# Altium footprint library PRL_PDC.PcbLib: 77 footprints (part 3 of 5)
Each footprint in its own frame and in the unit in brackets; x right, y up, seen from the top. Pads: shape width x height; smd on the part's side, far side on the other; paste and mask are expansions set on the pad; w line width, h text height; cw(c..) or ccw(c..) is an arc to the next point about the centre after c.
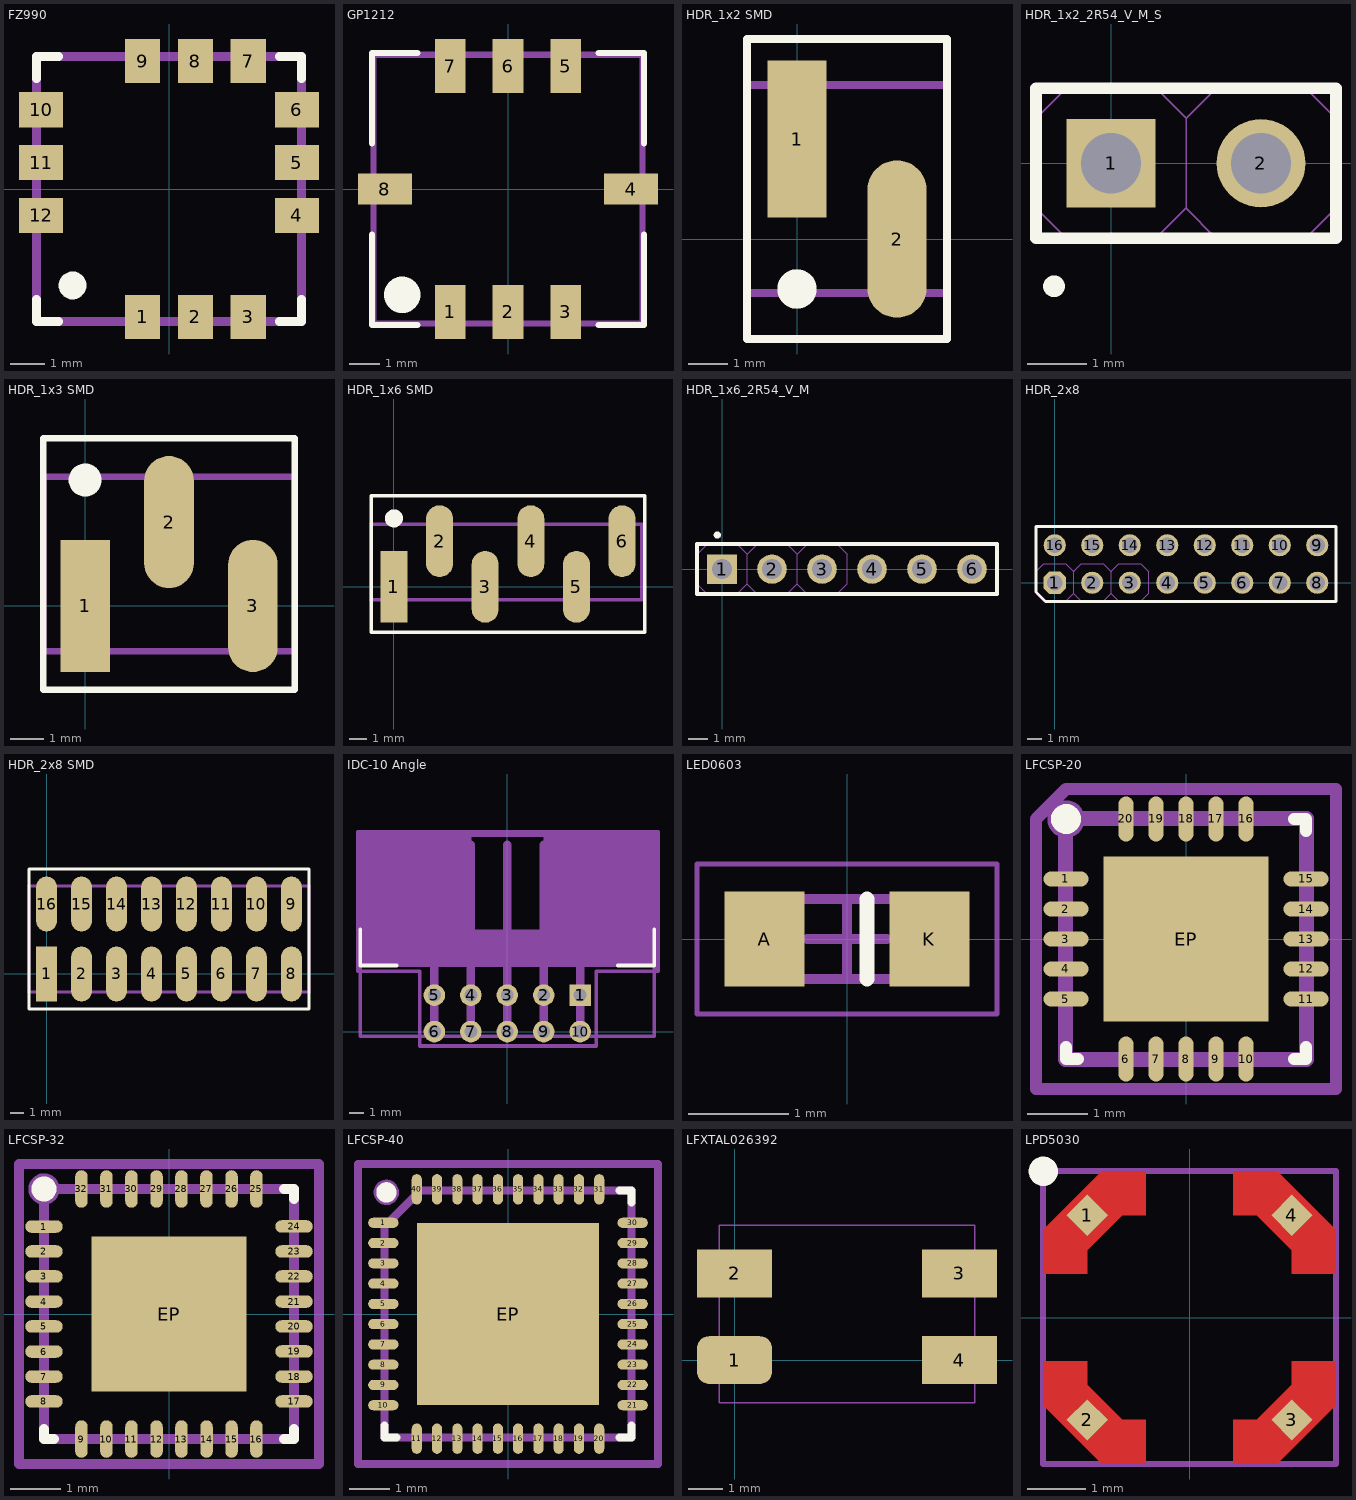
[diagram p2: the footprints below, top view; thin cyan lines are the x and y axes]

## FZ990 [mil]
height 118.11
pads (12):
  rect 40.16x50 smd paste-3.94: 1(-30,-145) 2(30,-145) 3(90,-145) 7(90,145) 8(30,145) 9(-30,145)
  rect 50x40.16 smd paste-3.94: 4(145,-30) 5(145,30) 6(145,90) 10(-145,90) 11(-145,30) 12(-145,-30)
Top Overlay:
  circle w15.75: c-109.32,-109.28 r7.87
  lines w10: -150,-125 -150,-150 -125,-150 ; -150,125 -150,150 -125,150 ; 125,-150 150,-150 150,-125 ; 125,150 150,150 150,125
Mechanical 1:
  lines w10: -150,-150 -150,0 -150,150 0,150 150,150 150,0 150,-150 0,-150 -150,-150
3D body: height 100.39, standoff 78.74, extent -125,-125 -109.32,-109.28
3D body: height 24.02, standoff 3.54, extent -152,-50 -112,-10
3D body: height 24.02, standoff 3.54, extent -152,10 -112,50
3D body: height 24.02, standoff 3.54, extent -152,70 -112,110
3D body: height 24.02, standoff 3.54, extent -50,112 -10,152
3D body: height 24.02, standoff 3.54, extent 10,112 50,152
3D body: height 24.02, standoff 3.54, extent 70,112 110,152
3D body: height 24.02, standoff 3.54, extent 112,70 152,110
3D body: height 24.02, standoff 3.54, extent 112,10 152,50
3D body: height 24.02, standoff 3.54, extent 112,-50 152,-10
3D body: height 24.02, standoff 3.54, extent 70,-152 110,-112
3D body: height 24.02, standoff 3.54, extent 10,-152 50,-112
3D body: height 24.02, standoff 3.54, extent -50,-152 -10,-112
3D body: height 100, standoff 15.75, extent -145,-145 145,145
3D body: height 23.62, standoff 3.94, extent -150,-150 150,150

## GP1212 [mm] "Minicircuits"
height 4
pads (8):
  rect 1.02x1.78 smd paste-0.1: 1(-1.91,-4.065) 2(0,-4.065) 3(1.91,-4.065) 5(1.91,4.065) 6(0,4.065) 7(-1.91,4.065)
  rect 1.78x1.02 smd paste-0.1: 4(4.07,-0.005) 8(-4.07,-0.005)
Top Overlay:
  circle w1: c-3.5,-3.5 r0.1
  lines w0.2: -4.5,-1.5 -4.5,-4.5 -3,-4.5 ; -4.5,1.5 -4.5,4.5 -3,4.5 ; 3,-4.5 4.5,-4.5 4.5,-1.5 ; 3,4.5 4.5,4.5 4.5,1.5
Mechanical 1:
  lines w0.2: -4.445,-4.45 -4.445,4.44 4.445,4.44 4.445,-4.45 -4.445,-4.45
3D body: height 4, standoff 0.1, extent -4.445,-4.45 4.445,4.44

## HDR_1x2 SMD [mm] "Male Header, Pitch 2.54mm, 2x1 Position, Mated Height 6mm, Tail Length 3mm"
height 6
pads (2):
  rect 1.5x4 smd: 1(0,2.54)
  oval 1.5x4 smd: 2(2.54,0)
Top Overlay:
  circle w0.5: c0,-1.27 r0.25
  lines w0.2: -1.27,-2.54 -1.27,5.08 3.81,5.08 3.81,-2.54 -1.27,-2.54
Mechanical 1:
  lines w0.2: -1.27,-1.372 3.81,-1.372 3.81,3.911 -1.27,3.911 -1.27,-1.372
3D body "TSM-102-04-T-SV.stp": height 6.89, standoff 0.03, extent -1.27,-1.372 3.81,3.912

## HDR_1x2_2R54_V_M_S [mm] "Male Header, Pitch 2.54mm, 4x1 Position, Mated Height 6mm, Tail Length 3mm"
height 6
pads (2):
  rect 1.5x1.5 hole 1.02: 1(0,0)
  round 1.5 hole 1.02: 2(2.54,0)
Top Overlay:
  circle w0.25: c-0.965,-2.083 r0.059
  lines w0.2: -1.27,-1.27 3.81,-1.27 3.81,1.27 -1.27,1.27 -1.27,-1.27
Mechanical 13:
  lines w0.025: 3.81,-0.762 3.302,-1.27 ; 3.81,0.762 3.302,1.27 1.778,1.27 1.27,0.762 ; -1.27,-0.762 -0.762,-1.27 ; -1.27,-0.762 -1.27,0.762 ; -1.27,-0.762 -1.27,0.762 ; -1.27,0.762 -0.762,1.27 0.762,1.27 1.27,0.762 ; -0.762,-1.27 0.762,-1.27 ; -0.762,-1.27 0.762,-1.27 ; 0.762,-1.27 1.27,-0.762 ; 1.27,-0.762 1.778,-1.27 ; 1.27,-0.762 1.27,0.762 ; 1.27,-0.762 1.27,0.762 ; 1.27,-0.762 1.27,0.762 ; 1.27,-0.762 1.27,0.762 ; 1.778,-1.27 3.302,-1.27 ; 1.778,-1.27 3.302,-1.27
3D body: height 9, standoff -3, extent 2.19,-0.349 2.887,0.349
3D body: height 2.54, standoff 0, extent 1.27,-1.27 3.81,1.27
3D body: height 9, standoff -3, extent -0.35,-0.349 0.347,0.349
3D body: height 2.54, standoff 0, extent -1.27,-1.27 1.27,1.27

## HDR_1x3 SMD [mm] "Male Header, Pitch 2.54mm, 3x1 Position, Mated Height 6mm, Tail Length 3mm"
height 6
pads (3):
  rect 1.5x4 smd: 1(0,0)
  oval 1.5x4 smd: 2(2.54,2.54) 3(5.08,0)
Top Overlay:
  circle w0.5: c0,3.81 r0.25
  lines w0.2: -1.27,-2.54 6.35,-2.54 6.35,5.08 -1.27,5.08 -1.27,-2.54
Mechanical 1:
  lines w0.2: -1.27,-1.372 -1.27,3.911 6.35,3.911 6.35,-1.372 -1.27,-1.372
3D body "TSM-103-04-T-SV.stp": height 6.89, standoff 0.03, extent -1.27,-1.371 6.35,3.912

## HDR_1x6 SMD [mm] "Male Header, Pitch 2.54mm, 6x1 Position, Mated Height 6mm, Tail Length 3mm"
height 6
pads (6):
  rect 1.5x4 smd: 1(0,0)
  oval 1.5x4 smd: 2(2.54,2.54) 3(5.08,0) 4(7.62,2.54) 5(10.16,0) 6(12.7,2.54)
Top Overlay:
  circle w0.5: c0,3.81 r0.25
  lines w0.2: -1.27,-2.54 -1.27,5.08 13.97,5.08 13.97,-2.54 -1.27,-2.54
Mechanical 1:
  lines w0.2: -1.27,-0.725 13.805,-0.725 13.805,3.475 -1.27,3.475 -1.27,-0.725
3D body "PM20206VBNN.STEP": height 6.54, standoff -0.11, extent -1.27,-0.725 13.805,3.475

## HDR_1x6_2R54_V_M [mm] "Male Header, Pitch 2.54mm, 6x1 Position, Mated Height 6mm, Tail Length 3mm"
height 6
pads (6):
  rect 1.5x1.5 hole 1.02: 1(0,0)
  round 1.5 hole 1.02: 2(2.54,0) 3(5.08,0) 4(7.62,0) 5(10.16,0) 6(12.7,0)
Top Overlay:
  circle w0.25: c-0.236,1.727 r0.059
  lines w0.2: 13.945,-1.27 -1.27,-1.27 -1.27,1.27 13.945,1.27 ; 13.97,-1.27 13.97,1.27
Mechanical 13:
  lines w0.025: -1.27,-0.762 -1.27,0.762 ; -1.27,-0.762 -1.27,0.762 ; -1.27,-0.762 -0.762,-1.27 ; -1.27,0.762 -0.762,1.27 0.762,1.27 1.27,0.762 ; -0.762,-1.27 0.762,-1.27 ; -0.762,-1.27 0.762,-1.27 ; 0.762,-1.27 1.27,-0.762 ; 1.27,-0.762 1.27,0.762 ; 1.27,-0.762 1.27,0.762 ; 1.27,-0.762 1.27,0.762 ; 1.27,-0.762 1.27,0.762 ; 1.27,-0.762 1.778,-1.27 ; 1.27,0.762 1.778,1.27 3.302,1.27 3.81,0.762 ; 1.778,-1.27 3.302,-1.27 ; 1.778,-1.27 3.302,-1.27 ; 3.302,-1.27 3.81,-0.762 ; 3.81,-0.762 3.81,0.762 ; 3.81,-0.762 3.81,0.762 ; 3.81,-0.762 3.81,0.762 ; 3.81,-0.762 3.81,0.762 ; 3.81,-0.762 4.318,-1.27 ; 3.81,0.762 4.318,1.27 5.842,1.27 6.35,0.762 ; 4.318,-1.27 5.842,-1.27 ; 4.318,-1.27 5.842,-1.27 ; 5.842,-1.27 6.35,-0.762 ; 6.35,-0.762 6.35,0.762 ; 6.35,-0.762 6.35,0.762
3D body: height 2.54, standoff 0, extent -1.27,-1.27 1.27,1.27
3D body: height 9, standoff -2.54, extent -0.35,-0.349 0.347,0.349
3D body: height 2.54, standoff 0, extent 1.27,-1.27 3.81,1.27
3D body: height 9, standoff -2.54, extent 2.19,-0.349 2.887,0.349
3D body: height 2.54, standoff 0, extent 3.81,-1.27 6.35,1.27
3D body: height 9, standoff -2.54, extent 4.73,-0.349 5.427,0.349
3D body: height 9, standoff -2.54, extent 7.27,-0.349 7.967,0.349
3D body: height 2.54, standoff 0, extent 6.35,-1.27 8.89,1.27
3D body: height 9, standoff -2.54, extent 9.81,-0.349 10.507,0.349
3D body: height 2.54, standoff 0, extent 8.89,-1.27 11.43,1.27
3D body: height 9, standoff -2.54, extent 12.35,-0.349 13.047,0.349
3D body: height 2.54, standoff 0, extent 11.43,-1.27 13.97,1.27

## HDR_2x8 [mm]
height 6
pads (16):
  oct 1.5x1.5 hole 1.02: 1(0,0)
  round 1.5 hole 1.02: 2(2.54,0) 3(5.08,0) 4(7.62,0) 5(10.16,0) 6(12.7,0) 7(15.24,0) 8(17.78,0) 9(17.78,2.54) 10(15.24,2.54) 11(12.7,2.54) 12(10.16,2.54) 13(7.62,2.54) 14(5.08,2.54) 15(2.54,2.54) 16(0,2.54)
Top Overlay:
  lines w0.2: -1.27,-0.635 -1.27,3.81 19.05,3.81 19.05,-1.27 -0.635,-1.27 -1.27,-0.635
Mechanical 13:
  lines w0.025: -1.27,-0.762 -1.27,0.762 ; -1.27,-0.762 -1.27,0.762 ; -1.27,-0.762 -0.762,-1.27 ; -1.27,0.762 -0.762,1.27 0.762,1.27 1.27,0.762 ; -0.762,-1.27 0.762,-1.27 ; -0.762,-1.27 0.762,-1.27 ; 0.762,-1.27 1.27,-0.762 ; 1.27,-0.762 1.27,0.762 ; 1.27,-0.762 1.27,0.762 ; 1.27,-0.762 1.27,0.762 ; 1.27,-0.762 1.27,0.762 ; 1.27,-0.762 1.778,-1.27 ; 1.27,0.762 1.778,1.27 3.302,1.27 3.81,0.762 ; 1.778,-1.27 3.302,-1.27 ; 1.778,-1.27 3.302,-1.27 ; 3.302,-1.27 3.81,-0.762 ; 3.81,-0.762 3.81,0.762 ; 3.81,-0.762 3.81,0.762 ; 3.81,-0.762 3.81,0.762 ; 3.81,-0.762 3.81,0.762 ; 3.81,-0.762 4.318,-1.27 ; 3.81,0.762 4.318,1.27 5.842,1.27 6.35,0.762 ; 4.318,-1.27 5.842,-1.27 ; 4.318,-1.27 5.842,-1.27 ; 5.842,-1.27 6.35,-0.762 ; 6.35,-0.762 6.35,0.762 ; 6.35,-0.762 6.35,0.762
3D body: height 2.54, standoff 0, extent -1.27,1.27 1.27,3.81
3D body: height 9, standoff -2.54, extent -0.35,2.191 0.347,2.889
3D body: height 2.54, standoff 0, extent 1.27,1.27 3.81,3.81
3D body: height 9, standoff -2.54, extent 2.19,2.191 2.887,2.889
3D body: height 2.54, standoff 0, extent 3.81,1.27 6.35,3.81
3D body: height 9, standoff -2.54, extent 4.73,2.191 5.427,2.889
3D body: height 2.54, standoff 0, extent 6.35,1.27 8.89,3.81
3D body: height 9, standoff -2.54, extent 7.27,2.191 7.967,2.889
3D body: height 2.54, standoff 0, extent 8.89,1.27 11.43,3.81
3D body: height 9, standoff -2.54, extent 9.81,2.191 10.507,2.889
3D body: height 2.54, standoff 0, extent 11.43,1.27 13.97,3.81
3D body: height 9, standoff -2.54, extent 12.35,2.191 13.047,2.889
3D body: height 2.54, standoff 0, extent 13.97,1.27 16.51,3.81
3D body: height 9, standoff -2.54, extent 14.89,2.191 15.587,2.889
3D body: height 2.54, standoff 0, extent 16.51,1.27 19.05,3.81
3D body: height 9, standoff -2.54, extent 17.43,2.191 18.127,2.889
3D body: height 2.54, standoff 0, extent 13.97,-1.27 16.51,1.27
3D body: height 9, standoff -2.54, extent 14.89,-0.349 15.587,0.349
3D body: height 2.54, standoff 0, extent 16.51,-1.27 19.05,1.27
3D body: height 9, standoff -2.54, extent 17.43,-0.349 18.127,0.349
3D body: height 2.54, standoff 0, extent -1.27,-1.27 1.27,1.27
3D body: height 9, standoff -2.54, extent -0.35,-0.349 0.347,0.349
3D body: height 2.54, standoff 0, extent 1.27,-1.27 3.81,1.27
3D body: height 9, standoff -2.54, extent 2.19,-0.349 2.887,0.349
3D body: height 2.54, standoff 0, extent 3.81,-1.27 6.35,1.27
3D body: height 9, standoff -2.54, extent 4.73,-0.349 5.427,0.349
3D body: height 9, standoff -2.54, extent 7.27,-0.349 7.967,0.349
3D body: height 2.54, standoff 0, extent 6.35,-1.27 8.89,1.27
3D body: height 9, standoff -2.54, extent 9.81,-0.349 10.507,0.349
3D body: height 2.54, standoff 0, extent 8.89,-1.27 11.43,1.27
3D body: height 9, standoff -2.54, extent 12.35,-0.349 13.047,0.349
3D body: height 2.54, standoff 0, extent 11.43,-1.27 13.97,1.27

## HDR_2x8 SMD [mm]
height 6
pads (16):
  rect 1.5x4 smd: 1(0,0)
  oval 1.5x4 smd: 2(2.54,0) 3(5.08,0) 4(7.62,0) 5(10.16,0) 6(12.7,0) 7(15.24,0) 8(17.78,0) 9(17.78,5.08) 10(15.24,5.08) 11(12.7,5.08) 12(10.16,5.08) 13(7.62,5.08) 14(5.08,5.08) 15(2.54,5.08) 16(0,5.08)
Top Overlay:
  lines w0.2: -1.27,-2.54 -1.27,7.62 19.05,7.62 19.05,-2.54 -1.27,-2.54
Mechanical 1:
  lines w0.2: -1.27,-1.308 19.05,-1.308 19.05,6.388 -1.27,6.388 -1.27,-1.308
3D body "TSM-108-04-T-DV.stp": height 6.82, standoff -0.04, extent -1.27,-1.308 19.05,6.388

## IDC-10 Angle [mm] "Connector Header Through Hole, Right Angle 10 position 0.100\" (2.54mm)"
height 7
pads (10):
  rect 1.5x1.5 hole 0.9: 1(5.08,2.54)
  round 1.5 hole 0.9: 2(2.54,2.54) 3(0,2.54) 4(-2.54,2.54) 5(-5.08,2.54) 6(-5.08,0) 7(-2.54,0) 8(0,0) 9(2.54,0) 10(5.08,0)
Top Overlay:
  lines w0.254: -10.25,7.14 -10.25,4.6 -7.71,4.6 ; 7.71,4.6 10.25,4.6 10.25,7.14
Mechanical 1:
  lines w0.254: -10.25,-0.32 -10.25,13.7 10.25,13.7 10.25,-0.32 -10.25,-0.32
Mechanical 13:
  lines w0.6: -5.08,0.53 -5.08,13 ; -2.54,0.53 -2.54,13 ; 0,0.53 0,13 ; 2.54,0.53 2.54,13 ; 5.08,0.53 5.08,13
Mechanical 15:
  lines w0.254: -10.4,4.2 -10.4,13.9 10.5,13.9 10.5,4.2 6.2,4.2 6.2,-1 -6.1,-1 -6.1,4.2 -10.4,4.2
Mechanical 16:
  region: 10.25,4.5 10.25,13.7 2.54,13.7 2.54,7.1 -2.5,7.1 -2.5,13.7 -10.25,13.7 -10.25,4.5
3D body "IDC10_angle.stp": height 8.9, standoff -3, extent -10.25,-0.32 10.25,13.7

## LED0603 [mm] "Chip Diode, 2-Leads, Body 1,60x0,80mm, IPC Medium Density"
height 0.8
pads (2):
  rect 0.8x0.95 smd: A(-0.825,0) K(0.825,0)
Top Overlay:
  lines w0.15: 0.2,-0.4 0.2,0.4
Mechanical 13:
  lines w0.1: -0.8,-0.4 0.8,-0.4 0.8,0.4 -0.8,0.4 -0.8,-0.4
Mechanical 15:
  lines w0.05: -1.5,-0.75 1.5,-0.75 1.5,0.75 -1.5,0.75 -1.5,-0.75
  lines w0.1: -0.4,0 0.4,0 ; 0,-0.4 0,0.4
3D body: height 0.2, standoff 0, extent -0.5,-0.4 0.5,0.4
3D body: height 0.8, standoff 0, extent -0.5,-0.4 0.5,0.4
3D body: height 0.2, standoff 0, extent 0.5,-0.4 0.8,0.4
3D body: height 0.2, standoff 0, extent -0.8,-0.4 -0.5,0.4

## LFCSP-20 [mm] "20 LFCSP 4 mm × 4 mm Body"
height 1
pads (21):
  oval 0.75x0.25 smd: 1(-2,1) 2(-2,0.5) 3(-2,0) 4(-2,-0.5) 5(-2,-1) 11(2,-1) 12(2,-0.5) 13(2,0) 14(2,0.5) 15(2,1)
  oval 0.25x0.75 smd: 6(-1,-2) 7(-0.5,-2) 8(0,-2) 9(0.5,-2) 10(1,-2) 16(1,2) 17(0.5,2) 18(0,2) 19(-0.5,2) 20(-1,2)
  rect 2.75x2.75 smd: EP(0,0)
Top Overlay:
  circle w0.25: c-2,2 r0.125
  lines w0.2: -2,-1.8 -2,-2 -1.8,-2 ; 1.8,-2 2,-2 2,-1.8 ; 1.8,2 2,2 2,1.8
Mechanical 1:
  lines w0.254: -2.01,-2.01 2.01,-2.01 2.01,2.01 -2.01,2.01 -2.01,-2.01
Mechanical 13:
  circle w0.3: c-2,2 r0.162
Mechanical 15:
  lines w0.2: -0.5,0 0.5,0 ; 0,-0.5 0,0.5 ; -2.5,-2.5 2.5,-2.5 2.5,2.5 -2,2.5 -2.5,2 -2.5,-2.5
3D body "User Library-LFCSP-20_CP-20-8.step": height 0.8, standoff 0, extent -2.01,-2.01 2.01,2.01

## LFCSP-32 [mm] "32 LFCSP 5 mm × 5 mm Body, Very Thin Quad"
height 1
pads (33):
  oval 0.75x0.25 smd: 1(-2.5,1.75) 2(-2.5,1.25) 3(-2.5,0.75) 4(-2.5,0.25) 5(-2.5,-0.25) 6(-2.5,-0.75) 7(-2.5,-1.25) 8(-2.5,-1.75) 17(2.5,-1.75) 18(2.5,-1.25) 19(2.5,-0.75) 20(2.5,-0.25) 21(2.5,0.25) 22(2.5,0.75) 23(2.5,1.25) 24(2.5,1.75)
  oval 0.25x0.75 smd: 9(-1.75,-2.5) 10(-1.25,-2.5) 11(-0.75,-2.5) 12(-0.25,-2.5) 13(0.25,-2.5) 14(0.75,-2.5) 15(1.25,-2.5) 16(1.75,-2.5) 25(1.75,2.5) 26(1.25,2.5) 27(0.75,2.5) 28(0.25,2.5) 29(-0.25,2.5) 30(-0.75,2.5) 31(-1.25,2.5) 32(-1.75,2.5)
  rect 3.1x3.1 smd: EP(0,0)
Top Overlay:
  circle w0.25: c-2.5,2.5 r0.125
  lines w0.2: -2.5,-2.3 -2.5,-2.5 -2.3,-2.5 ; 2.3,-2.5 2.5,-2.5 2.5,-2.3 ; 2.3,2.5 2.5,2.5 2.5,2.3
Mechanical 13:
  circle w0.3: c-2.5,2.5 r0.162
  lines w0.2: -2.5,-2.5 2.5,-2.5 2.5,2.5 -2.5,2.5 -2.5,-2.5
Mechanical 15:
  lines w0.2: -0.5,0 0.5,0 ; 0,-0.5 0,0.5 ; -3,-3 -3,3 3,3 3,-3 -3,-3
3D body "QFN-32 V6.stp": height 1.05, standoff 0, extent -2.5,-2.5 2.5,2.5

## LFCSP-40 [mm] "QFN, 40-Leads, Body 6,1x6,1mm (max), Pitch 0,50mm, IPC Medium Density"
height 0.8
pads (41):
  oval 0.75x0.25 smd: 1(-3.075,2.25) 2(-3.075,1.75) 3(-3.075,1.25) 4(-3.075,0.75) 5(-3.075,0.25) 6(-3.075,-0.25) 7(-3.075,-0.75) 8(-3.075,-1.25) 9(-3.075,-1.75) 10(-3.075,-2.25) 21(3.075,-2.25) 22(3.075,-1.75) 23(3.075,-1.25) 24(3.075,-0.75) 25(3.075,-0.25) 26(3.075,0.25) 27(3.075,0.75) 28(3.075,1.25) 29(3.075,1.75) 30(3.075,2.25)
  oval 0.25x0.75 smd: 11(-2.25,-3.075) 12(-1.75,-3.075) 13(-1.25,-3.075) 14(-0.75,-3.075) 15(-0.25,-3.075) 16(0.25,-3.075) 17(0.75,-3.075) 18(1.25,-3.075) 19(1.75,-3.075) 20(2.25,-3.075) 31(2.25,3.075) 32(1.75,3.075) 33(1.25,3.075) 34(0.75,3.075) 35(0.25,3.075) 36(-0.25,3.075) 37(-0.75,3.075) 38(-1.25,3.075) 39(-1.75,3.075) 40(-2.25,3.075)
  rect 4.5x4.5 smd: EP(0,0)
Top Overlay:
  circle w0.25: c-3,3 r0.125
  lines w0.2: -3.05,-2.75 -3.05,-3.05 -2.75,-3.05 ; 2.75,-3.05 3.05,-3.05 3.05,-2.75 ; 2.75,3.05 3.05,3.05 3.05,2.75
Mechanical 13:
  circle w0.3: c-3,3 r0.162
  lines w0.2: -3.05,-3.05 -3.05,2.157 -2.157,3.05 3.05,3.05 3.05,-3.05 -3.05,-3.05
Mechanical 15:
  lines w0.2: -0.5,0 0.5,0 ; 0,-0.5 0,0.5 ; -3.7,-3.7 3.7,-3.7 3.7,3.7 -3.7,3.7 -3.7,-3.7
3D body "LFCSP CP-40-14 v4.step": height 0.73, standoff -0.02, extent -3.001,-3.001 3.001,3.001

## LFXTAL026392 [mm] "CRYSTAL 16 MHz, SMD, 7mm x 5mm, 100 ppm, 16 pF, 12SMX Series"
height 1.3
pads (4):
  rrect50% 2.2x1.4 smd: 1(0,0)
  rect 2.2x1.4 smd: 2(0,2.54) 3(6.6,2.54) 4(6.6,0)
Mechanical 13:
  lines w0.051: -0.45,-1.25 7.05,-1.25 7.05,3.95 -0.45,3.95 -0.45,-1.25
3D body: height 1.2, standoff 0, extent -0.45,-1.25 7.05,3.95

## LPD5030 [mm] "Shielded Coupled Inductors"
height 3
pads (4):
  rect 0.5x0.5 smd rot 135: 1(-1.75,1.75) 2(-1.75,-1.75) 3(1.75,-1.75) 4(1.75,1.75)
Top Layer:
  region: -2.5,-0.75 -1.75,-0.75 -1.75,-1.15 -1.15,-1.75 -0.75,-1.75 -0.75,-2.5 -1.5,-2.5 -2.5,-1.5
  region: 2.5,-0.75 1.75,-0.75 1.75,-1.15 1.15,-1.75 0.75,-1.75 0.75,-2.5 1.5,-2.5 2.5,-1.5
  region: 2.5,0.75 1.75,0.75 1.75,1.15 1.15,1.75 0.75,1.75 0.75,2.5 1.5,2.5 2.5,1.5
  region: -2.5,0.75 -1.75,0.75 -1.75,1.15 -1.15,1.75 -0.75,1.75 -0.75,2.5 -1.5,2.5 -2.5,1.5
Top Overlay:
  circle w0.25: c-2.5,2.5 r0.125
Mechanical 1:
  lines w0.1: -2.503,-2.503 -2.503,2.503 2.503,2.503 2.503,-2.503 -2.503,-2.503
3D body "Coilcraft-LPD5030.step": height 3.13, standoff 0, extent -2.503,-2.503 2.503,2.503